# Altium footprint library 9-Pcblib_Con.PcbLib: 266 footprints (part 11 of 17)
Each footprint in its own frame and in the unit in brackets; x right, y up, seen from the top. Pads: shape width x height; smd on the part's side, far side on the other; paste and mask are expansions set on the pad; w line width, h text height; cw(c..) or ccw(c..) is an arc to the next point about the centre after c.
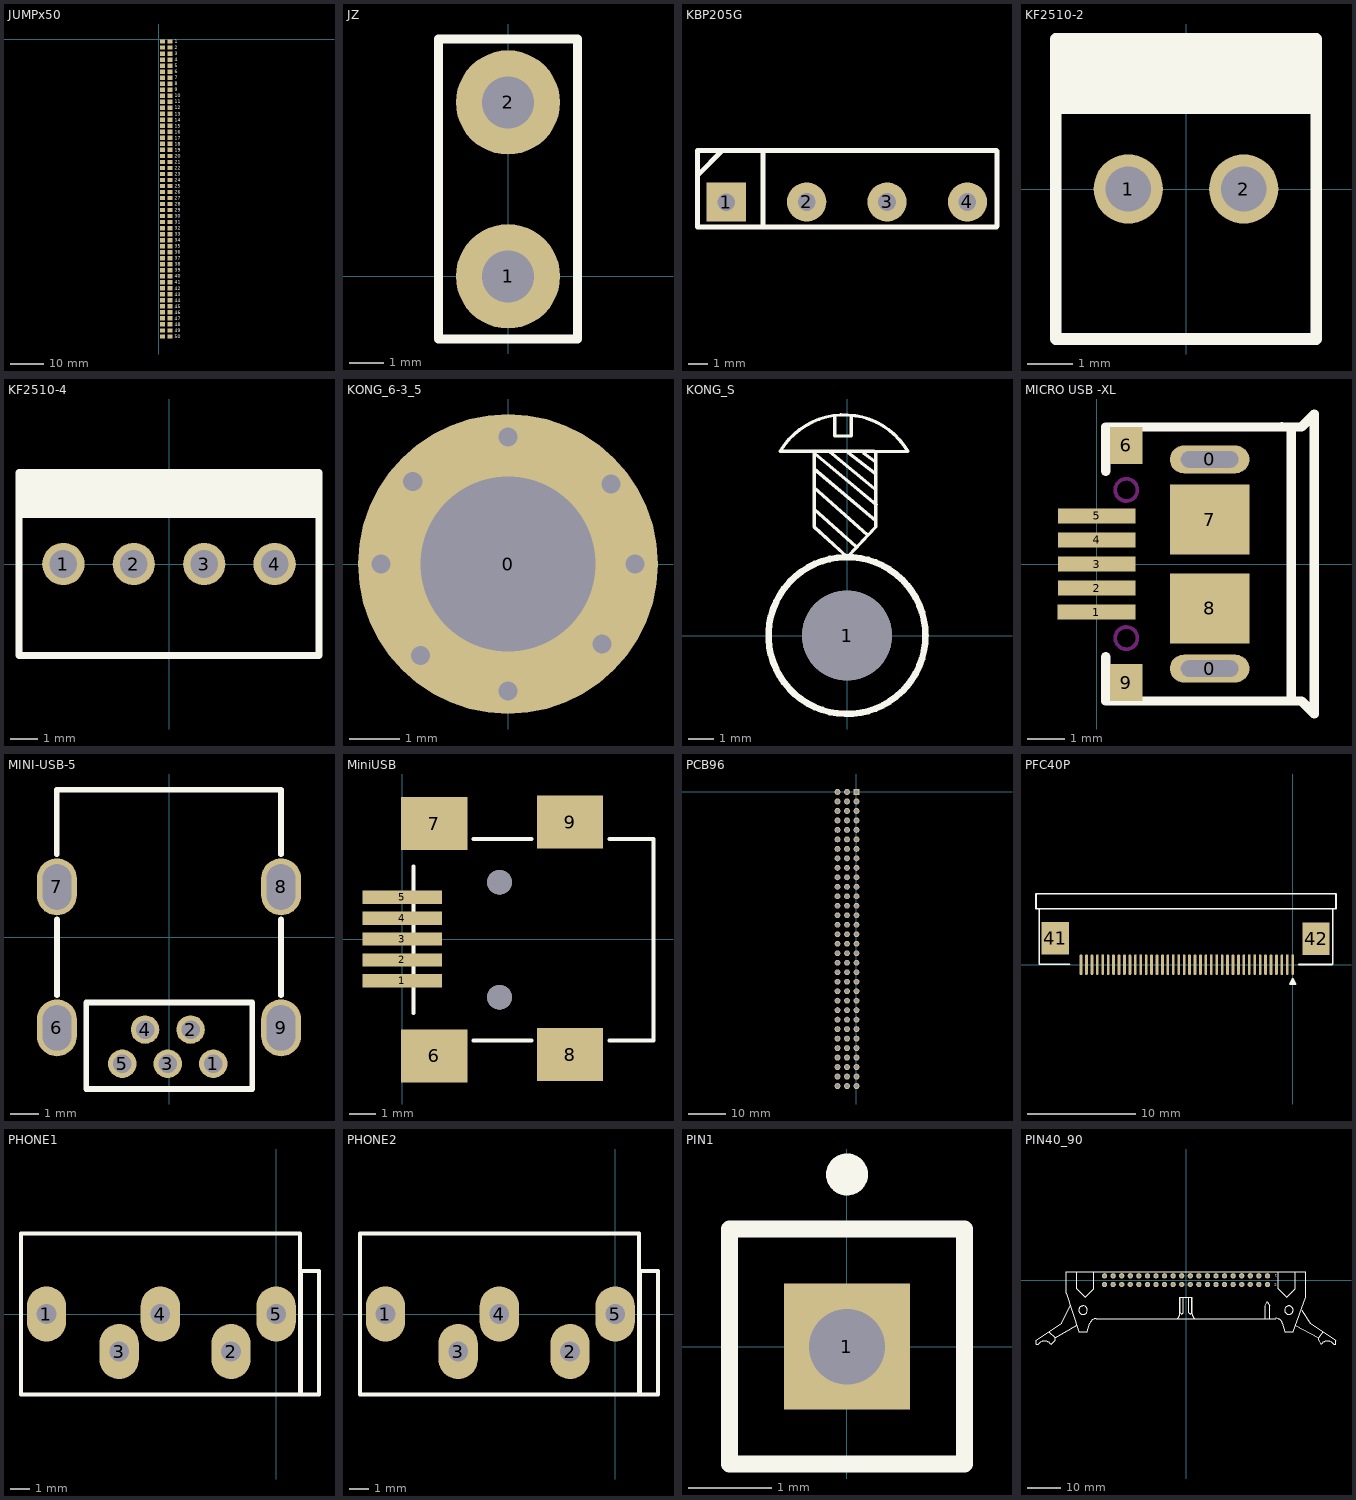
[diagram p10: the footprints below, top view; thin cyan lines are the x and y axes]

## JUMPx50 [mil]
pads (100):
  rect 60x50 smd: 1(40,-30) 2(130,-30) 3(40,-100) 4(130,-100) 5(40,-170) 6(130,-170) 7(40,-240) 8(130,-240) 9(40,-310) 10(130,-310) 11(40,-380) 12(130,-380) 13(40,-450) 14(130,-450) 15(40,-520) 16(130,-520) 17(40,-590) 18(130,-590) 19(40,-660) 20(130,-660) 21(40,-730) 22(130,-730) 23(40,-800) 24(130,-800) 25(40,-870) 26(130,-870) 27(40,-940) 28(130,-940) 29(40,-1010) 30(130,-1010) 31(40,-1080) 32(130,-1080) 33(40,-1150) 34(130,-1150) 35(40,-1220) 36(130,-1220) 37(40,-1290) 38(130,-1290) 39(40,-1360) 40(130,-1360) 41(40,-1430) 42(130,-1430) 43(40,-1500) 44(130,-1500) 45(40,-1570) 46(130,-1570) 47(40,-1640) 48(130,-1640) 49(40,-1710) 50(130,-1710) 51(40,-1780) 52(130,-1780) 53(40,-1850) 54(130,-1850) 55(40,-1920) 56(130,-1920) 57(40,-1990) 58(130,-1990) 59(40,-2060) 60(130,-2060) 61(40,-2130) 62(130,-2130) 63(40,-2200) 64(130,-2200) 65(40,-2270) 66(130,-2270) 67(40,-2340) 68(130,-2340) 69(40,-2410) 70(130,-2410) 71(40,-2480) 72(130,-2480) 73(40,-2550) 74(130,-2550) 75(40,-2620) 76(130,-2620) 77(40,-2690) 78(130,-2690) 79(40,-2760) 80(130,-2760) 81(40,-2830) 82(130,-2830) 83(40,-2900) 84(130,-2900) 85(40,-2970) 86(130,-2970) 87(40,-3040) 88(130,-3040) 89(40,-3110) 90(130,-3110) 91(40,-3180) 92(130,-3180) 93(40,-3250) 94(130,-3250) 95(40,-3320) 96(130,-3320) 97(40,-3390) 98(130,-3390) 99(40,-3460) 100(130,-3460)
Top Overlay:
  text "33" at 185,-2290 h39.37
  text "34" at 185,-2360 h39.37
  text "36" at 185,-2500 h39.37
  text "35" at 185,-2430 h39.37
  text "39" at 185,-2710 h39.37
  text "40" at 185,-2780 h39.37
  text "38" at 185,-2640 h39.37
  text "37" at 185,-2570 h39.37
  text "17" at 185,-1170 h39.37
  text "18" at 185,-1240 h39.37
  text "20" at 185,-1380 h39.37
  text "19" at 185,-1310 h39.37
  text "23" at 185,-1590 h39.37
  text "24" at 185,-1660 h39.37
  text "22" at 185,-1520 h39.37
  text "21" at 185,-1450 h39.37
  text "29" at 185,-2010 h39.37
  text "30" at 185,-2080 h39.37
  text "32" at 185,-2220 h39.37
  text "31" at 185,-2150 h39.37
  text "27" at 185,-1870 h39.37
  text "28" at 185,-1940 h39.37
  text "26" at 185,-1800 h39.37
  text "25" at 185,-1730 h39.37
  text "9" at 185,-610 h39.37
  text "10" at 185,-680 h39.37
  text "12" at 185,-820 h39.37
  text "11" at 185,-750 h39.37
  text "15" at 185,-1030 h39.37
  text "16" at 185,-1100 h39.37
  text "14" at 185,-960 h39.37
  text "13" at 185,-890 h39.37
  text "5" at 185,-330 h39.37
  text "6" at 185,-400 h39.37
  text "8" at 185,-540 h39.37
  text "7" at 185,-470 h39.37
  text "3" at 185,-190 h39.37
  text "4" at 185,-260 h39.37
  text "2" at 185,-120 h39.37
  text "1" at 185,-50 h39.37
  text "41" at 185,-2850 h39.37
  text "42" at 185,-2920 h39.37
  text "44" at 185,-3060 h39.37
  text "43" at 185,-2990 h39.37
  text "47" at 185,-3270 h39.37
  text "48" at 185,-3340 h39.37
  text "46" at 185,-3200 h39.37
  text "45" at 185,-3130 h39.37
  text "50" at 185,-3480 h39.37
  text "49" at 185,-3410 h39.37
3D body: height 21.65, standoff 0, extent 46,-2295 124.74,-2245.39
3D body: height 21.65, standoff 0, extent 46,-2365 124.74,-2315.39
3D body: height 21.65, standoff 0, extent 46,-2505 124.74,-2455.39
3D body: height 21.65, standoff 0, extent 46,-2435 124.74,-2385.39
3D body: height 21.65, standoff 0, extent 46,-2715 124.74,-2665.39
3D body: height 21.65, standoff 0, extent 46,-2785 124.74,-2735.39
3D body: height 21.65, standoff 0, extent 46,-2645 124.74,-2595.39
3D body: height 21.65, standoff 0, extent 46,-2575 124.74,-2525.39
3D body: height 21.65, standoff 0, extent 46,-1175 124.74,-1125.39
3D body: height 21.65, standoff 0, extent 46,-1245 124.74,-1195.39
3D body: height 21.65, standoff 0, extent 46,-1385 124.74,-1335.39
3D body: height 21.65, standoff 0, extent 46,-1315 124.74,-1265.39
3D body: height 21.65, standoff 0, extent 46,-1595 124.74,-1545.39
3D body: height 21.65, standoff 0, extent 46,-1665 124.74,-1615.39
3D body: height 21.65, standoff 0, extent 46,-1525 124.74,-1475.39
3D body: height 21.65, standoff 0, extent 46,-1455 124.74,-1405.39
3D body: height 21.65, standoff 0, extent 46,-2015 124.74,-1965.39
3D body: height 21.65, standoff 0, extent 46,-2085 124.74,-2035.39
3D body: height 21.65, standoff 0, extent 46,-2225 124.74,-2175.39
3D body: height 21.65, standoff 0, extent 46,-2155 124.74,-2105.39
3D body: height 21.65, standoff 0, extent 46,-1875 124.74,-1825.39
3D body: height 21.65, standoff 0, extent 46,-1945 124.74,-1895.39
3D body: height 21.65, standoff 0, extent 46,-1805 124.74,-1755.39
3D body: height 21.65, standoff 0, extent 46,-1735 124.74,-1685.39
3D body: height 21.65, standoff 0, extent 46,-615 124.74,-565.39
3D body: height 21.65, standoff 0, extent 46,-685 124.74,-635.39
3D body: height 21.65, standoff 0, extent 46,-825 124.74,-775.39
3D body: height 21.65, standoff 0, extent 46,-755 124.74,-705.39
3D body: height 21.65, standoff 0, extent 46,-1035 124.74,-985.39
3D body: height 21.65, standoff 0, extent 46,-1105 124.74,-1055.39
3D body: height 21.65, standoff 0, extent 46,-965 124.74,-915.39
3D body: height 21.65, standoff 0, extent 46,-895 124.74,-845.39
3D body: height 21.65, standoff 0, extent 46,-335 124.74,-285.39
3D body: height 21.65, standoff 0, extent 46,-405 124.74,-355.39
3D body: height 21.65, standoff 0, extent 46,-545 124.74,-495.39
3D body: height 21.65, standoff 0, extent 46,-475 124.74,-425.39
3D body: height 21.65, standoff 0, extent 46,-195 124.74,-145.39
3D body: height 21.65, standoff 0, extent 46,-265 124.74,-215.39
3D body: height 21.65, standoff 0, extent 46,-125 124.74,-75.39
3D body: height 21.65, standoff 0, extent 46,-55 124.74,-5.39
3D body: height 21.65, standoff 0, extent 46,-2855 124.74,-2805.39
3D body: height 21.65, standoff 0, extent 46,-2925 124.74,-2875.39
3D body: height 21.65, standoff 0, extent 46,-3065 124.74,-3015.39
3D body: height 21.65, standoff 0, extent 46,-2995 124.74,-2945.39
3D body: height 21.65, standoff 0, extent 46,-3275 124.74,-3225.39
3D body: height 21.65, standoff 0, extent 46,-3345 124.74,-3295.39
3D body: height 21.65, standoff 0, extent 46,-3205 124.74,-3155.39
3D body: height 21.65, standoff 0, extent 46,-3135 124.74,-3085.39
3D body: height 21.65, standoff 0, extent 46,-3485 124.74,-3435.39
3D body: height 21.65, standoff 0, extent 46,-3415 124.74,-3365.39

## JZ [mm]
pads (2):
  round 3 hole 1.5: 1(0,0) 2(0,5)
Top Overlay:
  lines w0.254: -2,-1.8 -2,6.825 2,6.825 2,-1.8 -2,-1.8

## KBP205G [mm]
pads (4):
  rect 2x2 hole 0.9: 1(-100.14,26.67)
  round 2 hole 0.9: 2(-96.04,26.68) 3(-91.94,26.68) 4(-87.84,26.68)
Top Overlay:
  lines w0.254: -101.61,25.4 -101.61,29.3 -86.364,29.3 cw(c-86.364,29.266) -86.34,29.29 -86.34,25.458 cw(c-86.408,25.458) -86.36,25.41 cw(c-86.384,25.434) -86.384,25.4 -101.6,25.4 ; -101.61,28.04 ccw(c-101.61,28.064) -101.593,28.047 -100.34,29.3 ; -98.27,29.3 -98.27,25.448 ccw(c-98.202,25.448) -98.25,25.4

## KF2510-2 [mil]
height 433.07
pads (2):
  round 60 hole 39.37: 1(-50,0) 2(50,0)
Top Overlay:
  rectangle: -112.97,70 108.01,129.92
  lines w10: -112.99,70 107.99,70 ; -112.99,-129.92 112.99,-129.92 112.99,129.92 -112.99,129.92 -112.99,-129.92
3D body: height 469.29, standoff -131.5, extent -98.99,-114.95 101.01,113.39

## KF2510-4 [mil]
pads (4):
  round 60 hole 39.37: 1(-150,0) 2(-50,0) 3(50,0) 4(150,0)
Top Overlay:
  rectangle: -212.99,70 212.99,129.92
  lines w10: -212.99,70 212.99,70 ; -212.99,-129.92 -212.99,129.92 212.99,129.92 212.99,-129.92 -212.99,-129.92
3D body: height 469.29, standoff -131.5, extent -198.5,-114.5 201.5,113.85

## KONG_6-3_5 [mm]
height 0.127
pads (1):
  round 6 hole 3.5: 0(0,0)
via 1.88,-1.6 diameter 0.762 hole 0.381
via -1.753,-1.829 diameter 0.762 hole 0.381
via 2.057,1.6 diameter 0.762 hole 0.381
via -1.905,1.651 diameter 0.762 hole 0.381
via 2.54,0 diameter 0.762 hole 0.381
via -2.54,0 diameter 0.762 hole 0.381
via 0,-2.54 diameter 0.762 hole 0.381
via 0,2.54 diameter 0.762 hole 0.381

## KONG_S [mm]
height 5.08
pads (1):
  round 3.5 hole 3.5: 1(0,0)
Top Overlay:
  circle w0.254: c0,0 r3.05
  lines w0.127: -1.278,4.91 0.356,3.454 ; -1.278,5.744 0.782,3.916 ; -1.278,6.472 1.119,4.466 ; -1.242,7.058 1.137,5.087 ; -0.674,7.147 1.066,5.709 ; -0.479,8.531 -0.479,7.75 0.16,7.75 0.16,8.531 ; 0.036,7.111 1.066,6.312 ; 0.64,7.093 1.066,6.774 ; 1.048,7.164 -1.278,7.164 ; -1.278,7.164 -1.278,4.218 0.018,3.046 1.119,4.218 1.119,7.147 2.373,7.15 ccw(c-0.113,5.698) -2.591,7.164 -1.278,7.164
Bottom Overlay:
  circle w0.2: c0,0 r3.05
  lines w0.2: -2.587,7.212 cw(c-0.169,5.818) 2.276,7.163
  lines w0.254: -2.534,7.182 -2.547,7.194 2.333,7.194 ; -1.208,7.057 -1.208,4.279 0.006,3.065 1.17,4.229 1.17,7.032 ; -0.482,8.533 -0.47,8.546 -0.47,7.795 0.181,7.795 0.181,8.446

## MICRO USB -XL [mm]
pads (11):
  oval 2.15x0.75 hole 0.45 slot 1.55 at 0 deg: 0(3.05,-2.825) 0(3.05,2.825)
  rect 2.1x0.4 smd: 1(-0.005,-1.3) 2(0,-0.65) 3(0,0) 4(0,0.65) 5(0,1.3)
  rect 0.88x1 smd: 6(0.8,3.2) 9(0.8,-3.2)
  rect 2.15x1.9 smd: 7(3.05,1.2) 8(3.05,-1.2)
Top Overlay:
  lines w0.254: 0.25,-2.5 0.25,-3.7 5.25,-3.7 ; 0.25,2.5 0.25,3.7 5.25,3.7 ; 5,-3.7 5.03,-3.7 ; 5.25,-3.7 5.25,3.7 ; 5.25,-3.7 5.53,-3.7 5.88,-4.05 5.88,4.05 5.53,3.7 5.25,3.7 ; 5,3.7 5,3.705 5,3.7
Keep-Out Layer:
  circle w0.1: c0.8,2 r0.3
  circle w0.1: c0.8,-2 r0.3

## MINI-USB-5 [mm]
pads (9):
  round 1 hole 0.65: 1(1.558,-4.435) 2(0.758,-3.235) 3(-0.042,-4.435) 4(-0.842,-3.235) 5(-1.642,-4.435)
  oval 1.4x2 hole 1 slot 1.6 at 90 deg: 6(-3.937,-3.175) 7(-3.937,1.778) 8(3.937,1.778) 9(3.937,-3.175)
Top Overlay:
  lines w0.2: -3.942,2.921 -3.942,5.192 3.937,5.192 3.937,2.921 ; -3.937,-2.032 -3.937,0.635 ; 3.937,-2.032 3.937,0.635 ; -2.912,-5.324 2.93,-5.324 2.93,-2.286 -2.912,-2.286 -2.912,-3.292 -2.912,-5.324
Mechanical 13:
  lines w0.1: -3.937,5.217 3.937,5.217
3D body: height 6, standoff 0.05, extent -3.954,-5.275 4.001,5.276

## MiniUSB [mil]
pads (11):
  rect 120x20 smd: 1(-0.2,-62.99) 2(0,-31.5) 3(0,0) 4(0,31.5) 5(0,62.99)
  rect 100x80 smd: 6(48.04,-175.98) 7(48.04,174.02) 8(252.77,-174.21) 9(252.77,176.18)
  round 37 hole 37 unplated: ""(146.47,-87.6) ""(146.47,85.63)
Top Overlay:
  lines w6: 16.55,-111.22 16.55,109.25 ; 107.1,-152.56 194.5,-152.56 ; 107.1,150.59 194.5,150.59 ; 312.61,-152.56 378.75,-152.56 378.75,150.59 312.61,150.59

## PCB96 [mil]
pads (96):
  rect 62x62 hole 42: A1(0,0)
  round 62 hole 42: A2(0,-100) A3(0,-200) A4(0,-300) A5(0,-400) A6(0,-500) A7(0,-600) A8(0,-700) A9(0,-800) A10(0,-900) A11(0,-1000) A12(0,-1100) A13(0,-1200) A14(0,-1300) A15(0,-1400) A16(0,-1500) A17(0,-1600) A18(0,-1700) A19(0,-1800) A20(0,-1900) A21(0,-2000) A22(0,-2100) A23(0,-2200) A24(0,-2300) A25(0,-2400) A26(0,-2500) A27(0,-2600) A28(0,-2700) A29(0,-2800) A30(0,-2900) A31(0,-3000) A32(0,-3100) B1(-100,0) B2(-100,-100) B3(-100,-200) B4(-100,-300) B5(-100,-400) B6(-100,-500) B7(-100,-600) B8(-100,-700) B9(-100,-800) B10(-100,-900) B11(-100,-1000) B12(-100,-1100) B13(-100,-1200) B14(-100,-1300) B15(-100,-1400) B16(-100,-1500) B17(-100,-1600) B18(-100,-1700) B19(-100,-1800) B20(-100,-1900) B21(-100,-2000) B22(-100,-2100) B23(-100,-2200) B24(-100,-2300) B25(-100,-2400) B26(-100,-2500) B27(-100,-2600) B28(-100,-2700) B29(-100,-2800) B30(-100,-2900) B31(-100,-3000) B32(-100,-3100) C1(-200,0) C2(-200,-100) C3(-200,-200) C4(-200,-300) C5(-200,-400) C6(-200,-500) C7(-200,-600) C8(-200,-700) C9(-200,-800) C10(-200,-900) C11(-200,-1000) C12(-200,-1100) C13(-200,-1200) C14(-200,-1300) C15(-200,-1400) C16(-200,-1500) C17(-200,-1600) C18(-200,-1700) C19(-200,-1800) C20(-200,-1900) C21(-200,-2000) C22(-200,-2100) C23(-200,-2200) C24(-200,-2300) C25(-200,-2400) C26(-200,-2500) C27(-200,-2600) C28(-200,-2700) C29(-200,-2800) C30(-200,-2900) C31(-200,-3000) C32(-200,-3100)

## PFC40P [mm]
height 1.2
pads (42):
  oval 0.254x1.9 smd: 1(0,0) 2(-0.5,0) 3(-1,0) 4(-1.5,0) 5(-2,0) 6(-2.5,0) 7(-3,0) 8(-3.5,0) 9(-4,0) 10(-4.5,0) 11(-5,0) 12(-5.5,0) 13(-6,0) 14(-6.5,0) 15(-7,0) 16(-7.5,0) 17(-8,0) 18(-8.5,0) 19(-9,0) 20(-9.5,0) 21(-10,0) 22(-10.5,0) 23(-11,0) 24(-11.5,0) 25(-12,0) 26(-12.5,0) 27(-13,0) 28(-13.5,0) 29(-14,0) 30(-14.5,0) 31(-15,0) 32(-15.5,0) 33(-16,0) 34(-16.5,0) 35(-17,0) 36(-17.5,0) 37(-18,0) 38(-18.5,0) 39(-19,0) 40(-19.5,0)
  rect 2.5x3 smd: 41(-21.88,2.422) 42(2.159,2.388)
Top Overlay:
  lines w0.152: -23.353,5.105 -23.353,0.035 -20.559,0.035 ; -0.102,-1.669 0.152,-1.669 ; 0.004,-1.789 0.004,-1.281 ; 0.584,0.025 3.325,0.025 3.658,0.025 3.696,0.063 3.696,0.238 3.696,5.105 ; 0.004,-1.281 0.258,-1.789 -0.25,-1.789 0.004,-1.281 ; -23.647,5.156 3.988,5.156 3.988,6.528 -23.647,6.528 -23.647,5.156
3D body: height 2, standoff 0, extent -22.758,-0.035 3.035,5.796

## PHONE1 [mm]
pads (5):
  oval 2x2.8 hole 1: 1(-11.7,0) 2(-2.3,-1.91) 3(-8,-1.91) 4(-5.9,0) 5(0,0)
Top Overlay:
  lines w0.203: -13,-4.09 1.2,-4.09 1.2,4.09 -13,4.09 -13,-4.09 ; 1.27,-4.09 1.27,2.2 2.18,2.2 2.18,-4.09 1.27,-4.09
3D body: height 10.5, standoff -3, extent -13.194,-5.777 7.606,6.223

## PHONE2 [mm]
pads (5):
  oval 2x2.8 hole 1: 1(-11.7,0) 2(-2.3,-1.91) 3(-8,-1.91) 4(-5.9,0) 5(0,0)
Top Overlay:
  lines w0.203: -13,-4.09 -13,4.09 1.2,4.09 1.2,-4.09 -13,-4.09 ; 1.27,-4.09 2.18,-4.09 2.18,2.2 1.27,2.2 1.27,-4.09
3D body: height 3, standoff -10.5, extent -13.067,-6.158 7.733,5.842

## PIN1 [mm] "Connector; Plug"
pads (1):
  rect 1.5x1.5 hole 0.9: 1(0,0)
Top Overlay:
  circle w0.25: c0,2.05 r0.125
  lines w0.2: -1.4,-1.4 -1.4,1.4 1.4,1.4 1.4,-1.4 -1.4,-1.4
3D body: height 7.54, standoff -2.46, extent -1.27,-1.27 1.27,1.27

## PIN40_90 [mil]
height 47.24
pads (40):
  round 62 hole 35.43: 1(950,50) 2(950,-50) 3(850,50) 4(850,-50) 5(750,50) 6(750,-50) 7(650,50) 8(650,-50) 9(550,50) 10(550,-50) 11(450,50) 12(450,-50) 13(350,50) 14(350,-50) 15(250,50) 16(250,-50) 17(150,50) 18(150,-50) 19(50,50) 20(50,-50) 21(-50,50) 22(-50,-50) 23(-150,50) 24(-150,-50) 25(-250,50) 26(-250,-50) 27(-350,50) 28(-350,-50) 29(-450,50) 30(-450,-50) 31(-550,50) 32(-550,-50) 33(-650,50) 34(-650,-50) 35(-750,50) 36(-750,-50) 37(-850,50) 38(-850,-50) 39(-950,50) 40(-950,-50)
Top Overlay:
  circle w8: c-1200,-350 r50
  circle w8: c1200,-350 r50
  lines w8: -1725,-750 -1750,-750 -1750,-700 -1450,-500 -1350,-300 ; -1724.61,-749.67 cw(c-1650,-800) -1575.39,-749.67 ; -1600,-600 -1525,-675 ; -1575,-750 -1525,-700 -1525,-675 ; -1275,-525 -1525,-675 ; -1275,100 -1275,-100 -1175,-200 -1075,-100 -1075,100 ; -1125,-500 -1150,-600 -1250,-600 -1400,-150 -1400,100 1400,100 1400,-200 1250,-600 1150,-600 1125,-500 ; -1121.33,-501.82 cw(c-1050,-525) -1050,-450 1050,-450 ; -125,-450 ccw(c-125,-400) -75,-400 -75,-200 75,-200 75,-400 ccw(c125,-400) 125,-450 ; -66.67,-200 -66.67,-383.33 -50,-400 -33.33,-383.33 -33.33,-200 ; 33.33,-200 33.33,-383.33 50,-400 66.67,-383.33 66.67,-200 ; 925,-450 925,-300 950,-250 975,-300 975,-450 ; 1050,-445.83 cw(c1050,-525) 1125.29,-500.54 ; 1075,100 1075,-100 1175,-200 1275,-100 1275,100 ; 1275,-525 1550,-675 ; 1350,-350 1450,-500 1750,-700 1750,-750 1725,-750 ; 1575,-750 1550,-700 1550,-675 ; 1575.39,-749.67 cw(c1650,-800) 1724.61,-749.67 ; 1600,-600 1550,-675
  text "1" at 1063,66 h30
  text "2" at 1059,-42 h30
3D body: height 340, standoff -112, extent -1769.3,-598.76 1766.51,97.6